# Altium footprint library CONN_HDR_MINI_ST.PcbLib: 116 footprints (part 8 of 10)
Each footprint in its own frame and in the unit in brackets; x right, y up, seen from the top. Pads: shape width x height; smd on the part's side, far side on the other; paste and mask are expansions set on the pad; w line width, h text height; cw(c..) or ccw(c..) is an arc to the next point about the centre after c.
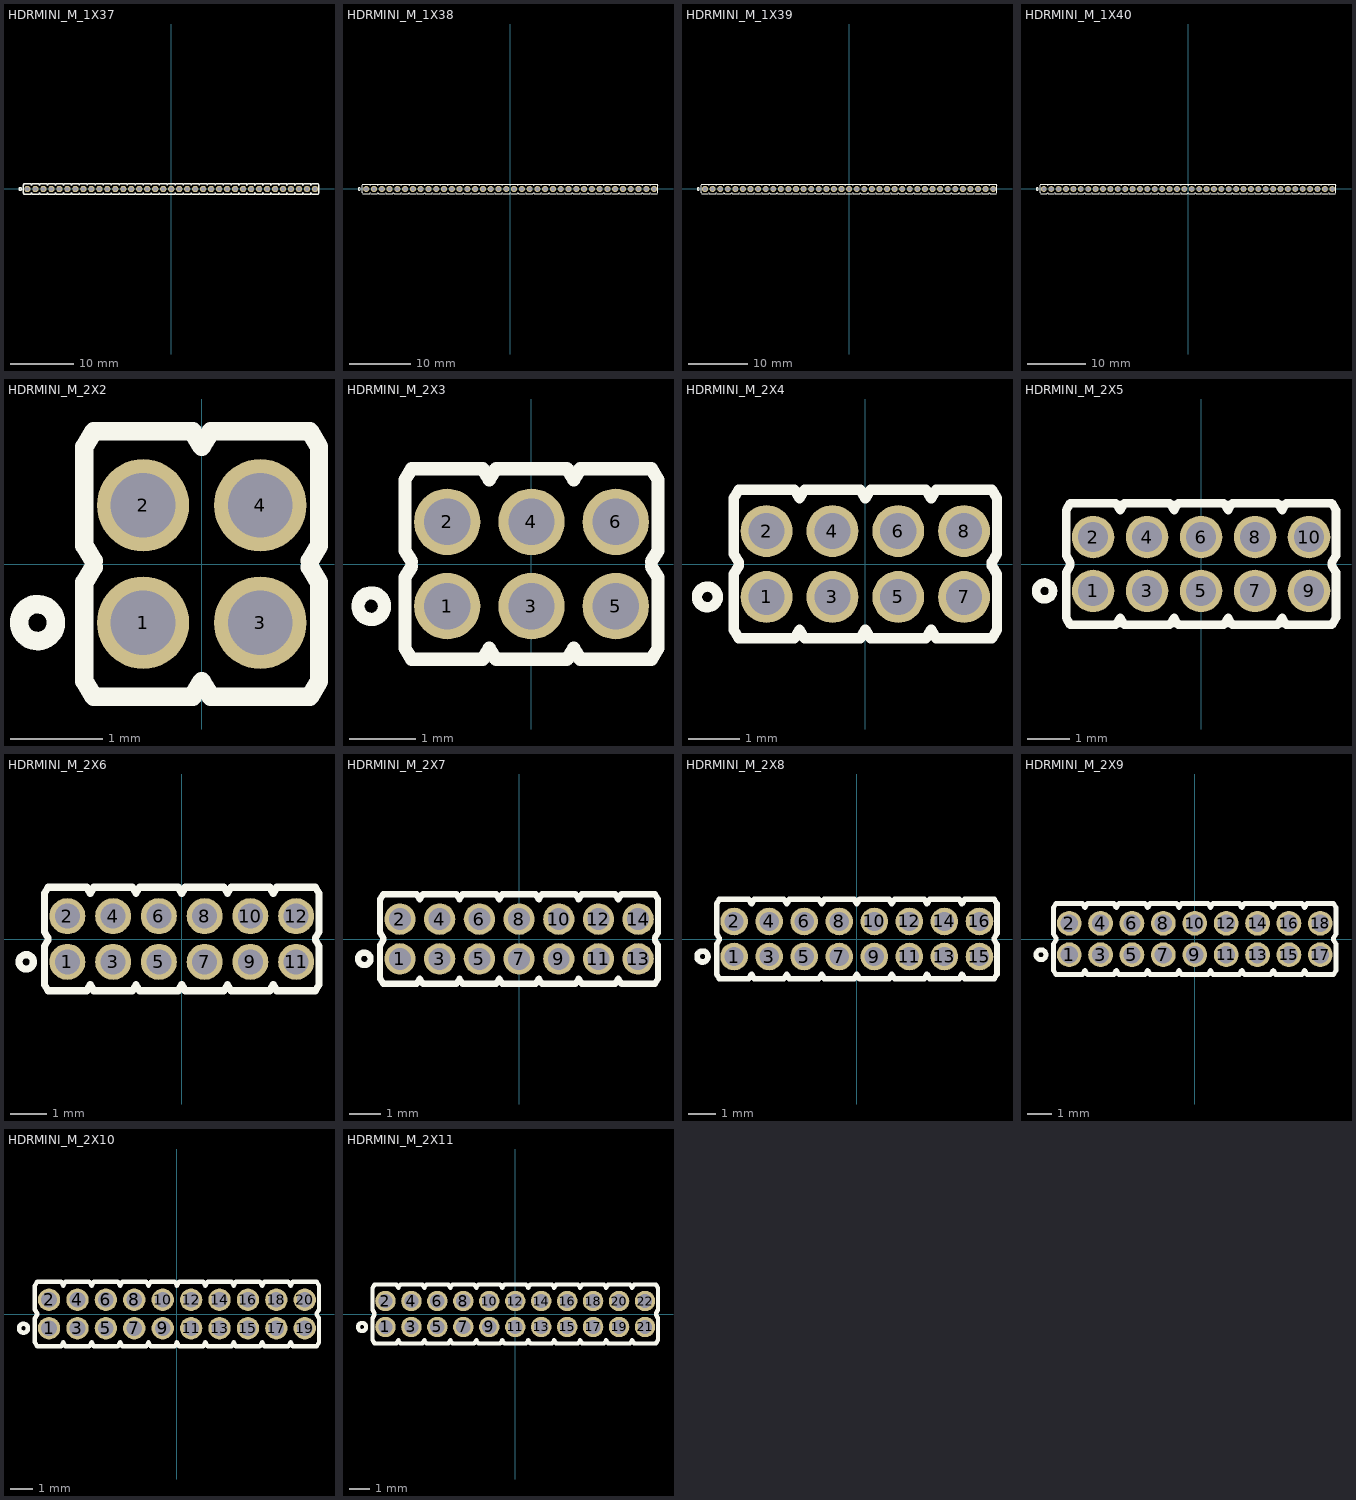
[diagram p7: the footprints below, top view; thin cyan lines are the x and y axes]

## HDRMINI_M_1X37 [mm] "mini header (50mil pitch)"
pads (37):
  round 1 / inner round 1 / far side oval 1x1.4 hole 0.7 mask+0.05: 1(-22.86,0) 2(-21.59,0) 3(-20.32,0) 4(-19.05,0) 5(-17.78,0) 6(-16.51,0) 7(-15.24,0) 8(-13.97,0) 9(-12.7,0) 10(-11.43,0) 11(-10.16,0) 12(-8.89,0) 13(-7.62,0) 14(-6.35,0) 15(-5.08,0) 16(-3.81,0) 17(-2.54,0) 18(-1.27,0) 19(0,0) 20(1.27,0) 21(2.54,0) 22(3.81,0) 23(5.08,0) 24(6.35,0) 25(7.62,0) 26(8.89,0) 27(10.16,0) 28(11.43,0) 29(12.7,0) 30(13.97,0) 31(15.24,0) 32(16.51,0) 33(17.78,0) 34(19.05,0) 35(20.32,0) 36(21.59,0) 37(22.86,0)
Top Overlay:
  drawing of 225 lines, arcs and shapes, not listed
3D body: height 7.3, standoff -2.5, extent 15.04,-0.2 15.44,0.2
3D body: height 2.8, standoff 0, extent 14.605,-0.635 15.875,0.635
3D body: height 7.3, standoff -2.5, extent 16.31,-0.2 16.71,0.2
3D body: height 2.8, standoff 0, extent 15.875,-0.635 17.145,0.635
3D body: height 7.3, standoff -2.5, extent 17.58,-0.2 17.98,0.2
3D body: height 2.8, standoff 0, extent 17.145,-0.635 18.415,0.635
3D body: height 7.3, standoff -2.5, extent 18.85,-0.2 19.25,0.2
3D body: height 2.8, standoff 0, extent 18.415,-0.635 19.685,0.635
3D body: height 7.3, standoff -2.5, extent 20.12,-0.2 20.52,0.2
3D body: height 2.8, standoff 0, extent 19.685,-0.635 20.955,0.635
3D body: height 7.3, standoff -2.5, extent 21.39,-0.2 21.79,0.2
3D body: height 2.8, standoff 0, extent 20.955,-0.635 22.225,0.635
3D body: height 7.3, standoff -2.5, extent 22.66,-0.2 23.06,0.2
3D body: height 2.8, standoff 0, extent 22.225,-0.635 23.495,0.635
3D body: height 7.3, standoff -2.5, extent 13.77,-0.2 14.17,0.2
3D body: height 2.8, standoff 0, extent 13.335,-0.635 14.605,0.635
3D body: height 7.3, standoff -2.5, extent 2.34,-0.2 2.74,0.2
3D body: height 2.8, standoff 0, extent 1.905,-0.635 3.175,0.635
3D body: height 7.3, standoff -2.5, extent 3.61,-0.2 4.01,0.2
3D body: height 2.8, standoff 0, extent 3.175,-0.635 4.445,0.635
3D body: height 7.3, standoff -2.5, extent 4.88,-0.2 5.28,0.2
3D body: height 2.8, standoff 0, extent 4.445,-0.635 5.715,0.635
3D body: height 7.3, standoff -2.5, extent 6.15,-0.2 6.55,0.2
3D body: height 2.8, standoff 0, extent 5.715,-0.635 6.985,0.635
3D body: height 7.3, standoff -2.5, extent 7.42,-0.2 7.82,0.2
3D body: height 2.8, standoff 0, extent 6.985,-0.635 8.255,0.635
3D body: height 7.3, standoff -2.5, extent 8.69,-0.2 9.09,0.2
3D body: height 2.8, standoff 0, extent 8.255,-0.635 9.525,0.635
3D body: height 7.3, standoff -2.5, extent 9.96,-0.2 10.36,0.2
3D body: height 2.8, standoff 0, extent 9.525,-0.635 10.795,0.635
3D body: height 7.3, standoff -2.5, extent 11.23,-0.2 11.63,0.2
3D body: height 2.8, standoff 0, extent 10.795,-0.635 12.065,0.635
3D body: height 7.3, standoff -2.5, extent 12.5,-0.2 12.9,0.2
3D body: height 2.8, standoff 0, extent 12.065,-0.635 13.335,0.635
3D body: height 7.3, standoff -2.5, extent 1.07,-0.2 1.47,0.2
3D body: height 2.8, standoff 0, extent 0.635,-0.635 1.905,0.635
3D body: height 7.3, standoff -2.5, extent -10.36,-0.2 -9.96,0.2
3D body: height 2.8, standoff 0, extent -10.795,-0.635 -9.525,0.635
3D body: height 7.3, standoff -2.5, extent -9.09,-0.2 -8.69,0.2
3D body: height 2.8, standoff 0, extent -9.525,-0.635 -8.255,0.635
3D body: height 7.3, standoff -2.5, extent -7.82,-0.2 -7.42,0.2
3D body: height 2.8, standoff 0, extent -8.255,-0.635 -6.985,0.635
3D body: height 7.3, standoff -2.5, extent -6.55,-0.2 -6.15,0.2
3D body: height 2.8, standoff 0, extent -6.985,-0.635 -5.715,0.635
3D body: height 7.3, standoff -2.5, extent -5.28,-0.2 -4.88,0.2
3D body: height 2.8, standoff 0, extent -5.715,-0.635 -4.445,0.635
3D body: height 7.3, standoff -2.5, extent -4.01,-0.2 -3.61,0.2
3D body: height 2.8, standoff 0, extent -4.445,-0.635 -3.175,0.635
3D body: height 7.3, standoff -2.5, extent -2.74,-0.2 -2.34,0.2
3D body: height 2.8, standoff 0, extent -3.175,-0.635 -1.905,0.635
3D body: height 7.3, standoff -2.5, extent -1.47,-0.2 -1.07,0.2
3D body: height 2.8, standoff 0, extent -1.905,-0.635 -0.635,0.635
3D body: height 7.3, standoff -2.5, extent -0.2,-0.2 0.2,0.2
3D body: height 2.8, standoff 0, extent -0.635,-0.635 0.635,0.635
3D body: height 7.3, standoff -2.5, extent -11.63,-0.2 -11.23,0.2
3D body: height 2.8, standoff 0, extent -12.065,-0.635 -10.795,0.635
3D body: height 7.3, standoff -2.5, extent -23.06,-0.2 -22.66,0.2
3D body: height 2.8, standoff 0, extent -23.495,-0.635 -22.225,0.635
3D body: height 7.3, standoff -2.5, extent -21.79,-0.2 -21.39,0.2
3D body: height 2.8, standoff 0, extent -22.225,-0.635 -20.955,0.635
3D body: height 7.3, standoff -2.5, extent -20.52,-0.2 -20.12,0.2
3D body: height 2.8, standoff 0, extent -20.955,-0.635 -19.685,0.635
3D body: height 7.3, standoff -2.5, extent -19.25,-0.2 -18.85,0.2
3D body: height 2.8, standoff 0, extent -19.685,-0.635 -18.415,0.635
3D body: height 7.3, standoff -2.5, extent -17.98,-0.2 -17.58,0.2
3D body: height 2.8, standoff 0, extent -18.415,-0.635 -17.145,0.635
3D body: height 7.3, standoff -2.5, extent -16.71,-0.2 -16.31,0.2
3D body: height 2.8, standoff 0, extent -17.145,-0.635 -15.875,0.635
3D body: height 7.3, standoff -2.5, extent -15.44,-0.2 -15.04,0.2
3D body: height 2.8, standoff 0, extent -15.875,-0.635 -14.605,0.635
3D body: height 7.3, standoff -2.5, extent -14.17,-0.2 -13.77,0.2
3D body: height 2.8, standoff 0, extent -14.605,-0.635 -13.335,0.635
3D body: height 7.3, standoff -2.5, extent -12.9,-0.2 -12.5,0.2
3D body: height 2.8, standoff 0, extent -13.335,-0.635 -12.065,0.635

## HDRMINI_M_1X38 [mm] "mini header (50mil pitch)"
pads (38):
  round 1 / inner round 1 / far side oval 1x1.4 hole 0.7 mask+0.05: 1(-23.495,0) 2(-22.225,0) 3(-20.955,0) 4(-19.685,0) 5(-18.415,0) 6(-17.145,0) 7(-15.875,0) 8(-14.605,0) 9(-13.335,0) 10(-12.065,0) 11(-10.795,0) 12(-9.525,0) 13(-8.255,0) 14(-6.985,0) 15(-5.715,0) 16(-4.445,0) 17(-3.175,0) 18(-1.905,0) 19(-0.635,0) 20(0.635,0) 21(1.905,0) 22(3.175,0) 23(4.445,0) 24(5.715,0) 25(6.985,0) 26(8.255,0) 27(9.525,0) 28(10.795,0) 29(12.065,0) 30(13.335,0) 31(14.605,0) 32(15.875,0) 33(17.145,0) 34(18.415,0) 35(19.685,0) 36(20.955,0) 37(22.225,0) 38(23.495,0)
Top Overlay:
  drawing of 231 lines, arcs and shapes, not listed
3D body: height 2.8, standoff 0, extent -13.97,-0.635 -12.7,0.635
3D body: height 7.3, standoff -2.5, extent -13.535,-0.2 -13.135,0.2
3D body: height 2.8, standoff 0, extent -15.24,-0.635 -13.97,0.635
3D body: height 7.3, standoff -2.5, extent -14.805,-0.2 -14.405,0.2
3D body: height 2.8, standoff 0, extent -16.51,-0.635 -15.24,0.635
3D body: height 7.3, standoff -2.5, extent -16.075,-0.2 -15.675,0.2
3D body: height 2.8, standoff 0, extent -17.78,-0.635 -16.51,0.635
3D body: height 7.3, standoff -2.5, extent -17.345,-0.2 -16.945,0.2
3D body: height 2.8, standoff 0, extent -19.05,-0.635 -17.78,0.635
3D body: height 7.3, standoff -2.5, extent -18.615,-0.2 -18.215,0.2
3D body: height 2.8, standoff 0, extent -20.32,-0.635 -19.05,0.635
3D body: height 7.3, standoff -2.5, extent -19.885,-0.2 -19.485,0.2
3D body: height 2.8, standoff 0, extent -21.59,-0.635 -20.32,0.635
3D body: height 7.3, standoff -2.5, extent -21.155,-0.2 -20.755,0.2
3D body: height 2.8, standoff 0, extent -22.86,-0.635 -21.59,0.635
3D body: height 7.3, standoff -2.5, extent -22.425,-0.2 -22.025,0.2
3D body: height 2.8, standoff 0, extent -24.13,-0.635 -22.86,0.635
3D body: height 7.3, standoff -2.5, extent -23.695,-0.2 -23.295,0.2
3D body: height 2.8, standoff 0, extent -12.7,-0.635 -11.43,0.635
3D body: height 7.3, standoff -2.5, extent -12.265,-0.2 -11.865,0.2
3D body: height 2.8, standoff 0, extent -1.27,-0.635 0,0.635
3D body: height 7.3, standoff -2.5, extent -0.835,-0.2 -0.435,0.2
3D body: height 2.8, standoff 0, extent -2.54,-0.635 -1.27,0.635
3D body: height 7.3, standoff -2.5, extent -2.105,-0.2 -1.705,0.2
3D body: height 2.8, standoff 0, extent -3.81,-0.635 -2.54,0.635
3D body: height 7.3, standoff -2.5, extent -3.375,-0.2 -2.975,0.2
3D body: height 2.8, standoff 0, extent -5.08,-0.635 -3.81,0.635
3D body: height 7.3, standoff -2.5, extent -4.645,-0.2 -4.245,0.2
3D body: height 2.8, standoff 0, extent -6.35,-0.635 -5.08,0.635
3D body: height 7.3, standoff -2.5, extent -5.915,-0.2 -5.515,0.2
3D body: height 2.8, standoff 0, extent -7.62,-0.635 -6.35,0.635
3D body: height 7.3, standoff -2.5, extent -7.185,-0.2 -6.785,0.2
3D body: height 2.8, standoff 0, extent -8.89,-0.635 -7.62,0.635
3D body: height 7.3, standoff -2.5, extent -8.455,-0.2 -8.055,0.2
3D body: height 2.8, standoff 0, extent -10.16,-0.635 -8.89,0.635
3D body: height 7.3, standoff -2.5, extent -9.725,-0.2 -9.325,0.2
3D body: height 2.8, standoff 0, extent -11.43,-0.635 -10.16,0.635
3D body: height 7.3, standoff -2.5, extent -10.995,-0.2 -10.595,0.2
3D body: height 2.8, standoff 0, extent 0,-0.635 1.27,0.635
3D body: height 7.3, standoff -2.5, extent 0.435,-0.2 0.835,0.2
3D body: height 2.8, standoff 0, extent 11.43,-0.635 12.7,0.635
3D body: height 7.3, standoff -2.5, extent 11.865,-0.2 12.265,0.2
3D body: height 2.8, standoff 0, extent 10.16,-0.635 11.43,0.635
3D body: height 7.3, standoff -2.5, extent 10.595,-0.2 10.995,0.2
3D body: height 2.8, standoff 0, extent 8.89,-0.635 10.16,0.635
3D body: height 7.3, standoff -2.5, extent 9.325,-0.2 9.725,0.2
3D body: height 2.8, standoff 0, extent 7.62,-0.635 8.89,0.635
3D body: height 7.3, standoff -2.5, extent 8.055,-0.2 8.455,0.2
3D body: height 2.8, standoff 0, extent 6.35,-0.635 7.62,0.635
3D body: height 7.3, standoff -2.5, extent 6.785,-0.2 7.185,0.2
3D body: height 2.8, standoff 0, extent 5.08,-0.635 6.35,0.635
3D body: height 7.3, standoff -2.5, extent 5.515,-0.2 5.915,0.2
3D body: height 2.8, standoff 0, extent 3.81,-0.635 5.08,0.635
3D body: height 7.3, standoff -2.5, extent 4.245,-0.2 4.645,0.2
3D body: height 2.8, standoff 0, extent 2.54,-0.635 3.81,0.635
3D body: height 7.3, standoff -2.5, extent 2.975,-0.2 3.375,0.2
3D body: height 2.8, standoff 0, extent 1.27,-0.635 2.54,0.635
3D body: height 7.3, standoff -2.5, extent 1.705,-0.2 2.105,0.2
3D body: height 2.8, standoff 0, extent 12.7,-0.635 13.97,0.635
3D body: height 7.3, standoff -2.5, extent 13.135,-0.2 13.535,0.2
3D body: height 2.8, standoff 0, extent 22.86,-0.635 24.13,0.635
3D body: height 7.3, standoff -2.5, extent 23.295,-0.2 23.695,0.2
3D body: height 2.8, standoff 0, extent 21.59,-0.635 22.86,0.635
3D body: height 7.3, standoff -2.5, extent 22.025,-0.2 22.425,0.2
3D body: height 2.8, standoff 0, extent 20.32,-0.635 21.59,0.635
3D body: height 7.3, standoff -2.5, extent 20.755,-0.2 21.155,0.2
3D body: height 2.8, standoff 0, extent 19.05,-0.635 20.32,0.635
3D body: height 7.3, standoff -2.5, extent 19.485,-0.2 19.885,0.2
3D body: height 2.8, standoff 0, extent 17.78,-0.635 19.05,0.635
3D body: height 7.3, standoff -2.5, extent 18.215,-0.2 18.615,0.2
3D body: height 2.8, standoff 0, extent 16.51,-0.635 17.78,0.635
3D body: height 7.3, standoff -2.5, extent 16.945,-0.2 17.345,0.2
3D body: height 2.8, standoff 0, extent 15.24,-0.635 16.51,0.635
3D body: height 7.3, standoff -2.5, extent 15.675,-0.2 16.075,0.2
3D body: height 2.8, standoff 0, extent 13.97,-0.635 15.24,0.635
3D body: height 7.3, standoff -2.5, extent 14.405,-0.2 14.805,0.2

## HDRMINI_M_1X39 [mm] "mini header (50mil pitch)"
pads (39):
  round 1 / inner round 1 / far side oval 1x1.4 hole 0.7 mask+0.05: 1(-24.13,0) 2(-22.86,0) 3(-21.59,0) 4(-20.32,0) 5(-19.05,0) 6(-17.78,0) 7(-16.51,0) 8(-15.24,0) 9(-13.97,0) 10(-12.7,0) 11(-11.43,0) 12(-10.16,0) 13(-8.89,0) 14(-7.62,0) 15(-6.35,0) 16(-5.08,0) 17(-3.81,0) 18(-2.54,0) 19(-1.27,0) 20(0,0) 21(1.27,0) 22(2.54,0) 23(3.81,0) 24(5.08,0) 25(6.35,0) 26(7.62,0) 27(8.89,0) 28(10.16,0) 29(11.43,0) 30(12.7,0) 31(13.97,0) 32(15.24,0) 33(16.51,0) 34(17.78,0) 35(19.05,0) 36(20.32,0) 37(21.59,0) 38(22.86,0) 39(24.13,0)
Top Overlay:
  drawing of 237 lines, arcs and shapes, not listed
3D body: height 2.8, standoff 0, extent -14.605,-0.635 -13.335,0.635
3D body: height 7.3, standoff -2.5, extent -14.17,-0.2 -13.77,0.2
3D body: height 2.8, standoff 0, extent -15.875,-0.635 -14.605,0.635
3D body: height 7.3, standoff -2.5, extent -15.44,-0.2 -15.04,0.2
3D body: height 2.8, standoff 0, extent -17.145,-0.635 -15.875,0.635
3D body: height 7.3, standoff -2.5, extent -16.71,-0.2 -16.31,0.2
3D body: height 2.8, standoff 0, extent -18.415,-0.635 -17.145,0.635
3D body: height 7.3, standoff -2.5, extent -17.98,-0.2 -17.58,0.2
3D body: height 2.8, standoff 0, extent -19.685,-0.635 -18.415,0.635
3D body: height 7.3, standoff -2.5, extent -19.25,-0.2 -18.85,0.2
3D body: height 2.8, standoff 0, extent -20.955,-0.635 -19.685,0.635
3D body: height 7.3, standoff -2.5, extent -20.52,-0.2 -20.12,0.2
3D body: height 2.8, standoff 0, extent -22.225,-0.635 -20.955,0.635
3D body: height 7.3, standoff -2.5, extent -21.79,-0.2 -21.39,0.2
3D body: height 2.8, standoff 0, extent -23.495,-0.635 -22.225,0.635
3D body: height 7.3, standoff -2.5, extent -23.06,-0.2 -22.66,0.2
3D body: height 2.8, standoff 0, extent -24.765,-0.635 -23.495,0.635
3D body: height 7.3, standoff -2.5, extent -24.33,-0.2 -23.93,0.2
3D body: height 2.8, standoff 0, extent -13.335,-0.635 -12.065,0.635
3D body: height 7.3, standoff -2.5, extent -12.9,-0.2 -12.5,0.2
3D body: height 2.8, standoff 0, extent -1.905,-0.635 -0.635,0.635
3D body: height 7.3, standoff -2.5, extent -1.47,-0.2 -1.07,0.2
3D body: height 2.8, standoff 0, extent -3.175,-0.635 -1.905,0.635
3D body: height 7.3, standoff -2.5, extent -2.74,-0.2 -2.34,0.2
3D body: height 2.8, standoff 0, extent -4.445,-0.635 -3.175,0.635
3D body: height 7.3, standoff -2.5, extent -4.01,-0.2 -3.61,0.2
3D body: height 2.8, standoff 0, extent -5.715,-0.635 -4.445,0.635
3D body: height 7.3, standoff -2.5, extent -5.28,-0.2 -4.88,0.2
3D body: height 2.8, standoff 0, extent -6.985,-0.635 -5.715,0.635
3D body: height 7.3, standoff -2.5, extent -6.55,-0.2 -6.15,0.2
3D body: height 2.8, standoff 0, extent -8.255,-0.635 -6.985,0.635
3D body: height 7.3, standoff -2.5, extent -7.82,-0.2 -7.42,0.2
3D body: height 2.8, standoff 0, extent -9.525,-0.635 -8.255,0.635
3D body: height 7.3, standoff -2.5, extent -9.09,-0.2 -8.69,0.2
3D body: height 2.8, standoff 0, extent -10.795,-0.635 -9.525,0.635
3D body: height 7.3, standoff -2.5, extent -10.36,-0.2 -9.96,0.2
3D body: height 2.8, standoff 0, extent -12.065,-0.635 -10.795,0.635
3D body: height 7.3, standoff -2.5, extent -11.63,-0.2 -11.23,0.2
3D body: height 2.8, standoff 0, extent -0.635,-0.635 0.635,0.635
3D body: height 7.3, standoff -2.5, extent -0.2,-0.2 0.2,0.2
3D body: height 2.8, standoff 0, extent 10.795,-0.635 12.065,0.635
3D body: height 7.3, standoff -2.5, extent 11.23,-0.2 11.63,0.2
3D body: height 2.8, standoff 0, extent 9.525,-0.635 10.795,0.635
3D body: height 7.3, standoff -2.5, extent 9.96,-0.2 10.36,0.2
3D body: height 2.8, standoff 0, extent 8.255,-0.635 9.525,0.635
3D body: height 7.3, standoff -2.5, extent 8.69,-0.2 9.09,0.2
3D body: height 2.8, standoff 0, extent 6.985,-0.635 8.255,0.635
3D body: height 7.3, standoff -2.5, extent 7.42,-0.2 7.82,0.2
3D body: height 2.8, standoff 0, extent 5.715,-0.635 6.985,0.635
3D body: height 7.3, standoff -2.5, extent 6.15,-0.2 6.55,0.2
3D body: height 2.8, standoff 0, extent 4.445,-0.635 5.715,0.635
3D body: height 7.3, standoff -2.5, extent 4.88,-0.2 5.28,0.2
3D body: height 2.8, standoff 0, extent 3.175,-0.635 4.445,0.635
3D body: height 7.3, standoff -2.5, extent 3.61,-0.2 4.01,0.2
3D body: height 2.8, standoff 0, extent 1.905,-0.635 3.175,0.635
3D body: height 7.3, standoff -2.5, extent 2.34,-0.2 2.74,0.2
3D body: height 2.8, standoff 0, extent 0.635,-0.635 1.905,0.635
3D body: height 7.3, standoff -2.5, extent 1.07,-0.2 1.47,0.2
3D body: height 2.8, standoff 0, extent 12.065,-0.635 13.335,0.635
3D body: height 7.3, standoff -2.5, extent 12.5,-0.2 12.9,0.2
3D body: height 2.8, standoff 0, extent 23.495,-0.635 24.765,0.635
3D body: height 7.3, standoff -2.5, extent 23.93,-0.2 24.33,0.2
3D body: height 2.8, standoff 0, extent 22.225,-0.635 23.495,0.635
3D body: height 7.3, standoff -2.5, extent 22.66,-0.2 23.06,0.2
3D body: height 2.8, standoff 0, extent 20.955,-0.635 22.225,0.635
3D body: height 7.3, standoff -2.5, extent 21.39,-0.2 21.79,0.2
3D body: height 2.8, standoff 0, extent 19.685,-0.635 20.955,0.635
3D body: height 7.3, standoff -2.5, extent 20.12,-0.2 20.52,0.2
3D body: height 2.8, standoff 0, extent 18.415,-0.635 19.685,0.635
3D body: height 7.3, standoff -2.5, extent 18.85,-0.2 19.25,0.2
3D body: height 2.8, standoff 0, extent 17.145,-0.635 18.415,0.635
3D body: height 7.3, standoff -2.5, extent 17.58,-0.2 17.98,0.2
3D body: height 2.8, standoff 0, extent 15.875,-0.635 17.145,0.635
3D body: height 7.3, standoff -2.5, extent 16.31,-0.2 16.71,0.2
3D body: height 2.8, standoff 0, extent 14.605,-0.635 15.875,0.635
3D body: height 7.3, standoff -2.5, extent 15.04,-0.2 15.44,0.2
3D body: height 2.8, standoff 0, extent 13.335,-0.635 14.605,0.635
3D body: height 7.3, standoff -2.5, extent 13.77,-0.2 14.17,0.2

## HDRMINI_M_1X40 [mm] "mini header (50mil pitch)"
pads (40):
  round 1 / inner round 1 / far side oval 1x1.4 hole 0.7 mask+0.05: 1(-24.765,0) 2(-23.495,0) 3(-22.225,0) 4(-20.955,0) 5(-19.685,0) 6(-18.415,0) 7(-17.145,0) 8(-15.875,0) 9(-14.605,0) 10(-13.335,0) 11(-12.065,0) 12(-10.795,0) 13(-9.525,0) 14(-8.255,0) 15(-6.985,0) 16(-5.715,0) 17(-4.445,0) 18(-3.175,0) 19(-1.905,0) 20(-0.635,0) 21(0.635,0) 22(1.905,0) 23(3.175,0) 24(4.445,0) 25(5.715,0) 26(6.985,0) 27(8.255,0) 28(9.525,0) 29(10.795,0) 30(12.065,0) 31(13.335,0) 32(14.605,0) 33(15.875,0) 34(17.145,0) 35(18.415,0) 36(19.685,0) 37(20.955,0) 38(22.225,0) 39(23.495,0) 40(24.765,0)
Top Overlay:
  drawing of 243 lines, arcs and shapes, not listed
3D body: height 7.3, standoff -2.5, extent 24.565,-0.2 24.965,0.2
3D body: height 2.8, standoff 0, extent 24.13,-0.635 25.4,0.635
3D body: height 7.3, standoff -2.5, extent 13.135,-0.2 13.535,0.2
3D body: height 2.8, standoff 0, extent 12.7,-0.635 13.97,0.635
3D body: height 7.3, standoff -2.5, extent 14.405,-0.2 14.805,0.2
3D body: height 2.8, standoff 0, extent 13.97,-0.635 15.24,0.635
3D body: height 7.3, standoff -2.5, extent 15.675,-0.2 16.075,0.2
3D body: height 2.8, standoff 0, extent 15.24,-0.635 16.51,0.635
3D body: height 7.3, standoff -2.5, extent 16.945,-0.2 17.345,0.2
3D body: height 2.8, standoff 0, extent 16.51,-0.635 17.78,0.635
3D body: height 7.3, standoff -2.5, extent 18.215,-0.2 18.615,0.2
3D body: height 2.8, standoff 0, extent 17.78,-0.635 19.05,0.635
3D body: height 7.3, standoff -2.5, extent 19.485,-0.2 19.885,0.2
3D body: height 2.8, standoff 0, extent 19.05,-0.635 20.32,0.635
3D body: height 7.3, standoff -2.5, extent 20.755,-0.2 21.155,0.2
3D body: height 2.8, standoff 0, extent 20.32,-0.635 21.59,0.635
3D body: height 7.3, standoff -2.5, extent 22.025,-0.2 22.425,0.2
3D body: height 2.8, standoff 0, extent 21.59,-0.635 22.86,0.635
3D body: height 7.3, standoff -2.5, extent 23.295,-0.2 23.695,0.2
3D body: height 2.8, standoff 0, extent 22.86,-0.635 24.13,0.635
3D body: height 7.3, standoff -2.5, extent 11.865,-0.2 12.265,0.2
3D body: height 2.8, standoff 0, extent 11.43,-0.635 12.7,0.635
3D body: height 7.3, standoff -2.5, extent 0.435,-0.2 0.835,0.2
3D body: height 2.8, standoff 0, extent 0,-0.635 1.27,0.635
3D body: height 7.3, standoff -2.5, extent 1.705,-0.2 2.105,0.2
3D body: height 2.8, standoff 0, extent 1.27,-0.635 2.54,0.635
3D body: height 7.3, standoff -2.5, extent 2.975,-0.2 3.375,0.2
3D body: height 2.8, standoff 0, extent 2.54,-0.635 3.81,0.635
3D body: height 7.3, standoff -2.5, extent 4.245,-0.2 4.645,0.2
3D body: height 2.8, standoff 0, extent 3.81,-0.635 5.08,0.635
3D body: height 7.3, standoff -2.5, extent 5.515,-0.2 5.915,0.2
3D body: height 2.8, standoff 0, extent 5.08,-0.635 6.35,0.635
3D body: height 7.3, standoff -2.5, extent 6.785,-0.2 7.185,0.2
3D body: height 2.8, standoff 0, extent 6.35,-0.635 7.62,0.635
3D body: height 7.3, standoff -2.5, extent 8.055,-0.2 8.455,0.2
3D body: height 2.8, standoff 0, extent 7.62,-0.635 8.89,0.635
3D body: height 7.3, standoff -2.5, extent 9.325,-0.2 9.725,0.2
3D body: height 2.8, standoff 0, extent 8.89,-0.635 10.16,0.635
3D body: height 7.3, standoff -2.5, extent 10.595,-0.2 10.995,0.2
3D body: height 2.8, standoff 0, extent 10.16,-0.635 11.43,0.635
3D body: height 7.3, standoff -2.5, extent -0.835,-0.2 -0.435,0.2
3D body: height 2.8, standoff 0, extent -1.27,-0.635 0,0.635
3D body: height 7.3, standoff -2.5, extent -12.265,-0.2 -11.865,0.2
3D body: height 2.8, standoff 0, extent -12.7,-0.635 -11.43,0.635
3D body: height 7.3, standoff -2.5, extent -10.995,-0.2 -10.595,0.2
3D body: height 2.8, standoff 0, extent -11.43,-0.635 -10.16,0.635
3D body: height 7.3, standoff -2.5, extent -9.725,-0.2 -9.325,0.2
3D body: height 2.8, standoff 0, extent -10.16,-0.635 -8.89,0.635
3D body: height 7.3, standoff -2.5, extent -8.455,-0.2 -8.055,0.2
3D body: height 2.8, standoff 0, extent -8.89,-0.635 -7.62,0.635
3D body: height 7.3, standoff -2.5, extent -7.185,-0.2 -6.785,0.2
3D body: height 2.8, standoff 0, extent -7.62,-0.635 -6.35,0.635
3D body: height 7.3, standoff -2.5, extent -5.915,-0.2 -5.515,0.2
3D body: height 2.8, standoff 0, extent -6.35,-0.635 -5.08,0.635
3D body: height 7.3, standoff -2.5, extent -4.645,-0.2 -4.245,0.2
3D body: height 2.8, standoff 0, extent -5.08,-0.635 -3.81,0.635
3D body: height 7.3, standoff -2.5, extent -3.375,-0.2 -2.975,0.2
3D body: height 2.8, standoff 0, extent -3.81,-0.635 -2.54,0.635
3D body: height 7.3, standoff -2.5, extent -2.105,-0.2 -1.705,0.2
3D body: height 2.8, standoff 0, extent -2.54,-0.635 -1.27,0.635
3D body: height 7.3, standoff -2.5, extent -13.535,-0.2 -13.135,0.2
3D body: height 2.8, standoff 0, extent -13.97,-0.635 -12.7,0.635
3D body: height 7.3, standoff -2.5, extent -24.965,-0.2 -24.565,0.2
3D body: height 2.8, standoff 0, extent -25.4,-0.635 -24.13,0.635
3D body: height 7.3, standoff -2.5, extent -23.695,-0.2 -23.295,0.2
3D body: height 2.8, standoff 0, extent -24.13,-0.635 -22.86,0.635
3D body: height 7.3, standoff -2.5, extent -22.425,-0.2 -22.025,0.2
3D body: height 2.8, standoff 0, extent -22.86,-0.635 -21.59,0.635